# Altium footprint library Connectors SMD.PcbLib: 130 footprints (part 7 of 12)
Each footprint in its own frame and in the unit in brackets; x right, y up, seen from the top. Pads: shape width x height; smd on the part's side, far side on the other; paste and mask are expansions set on the pad; w line width, h text height; cw(c..) or ccw(c..) is an arc to the next point about the centre after c.
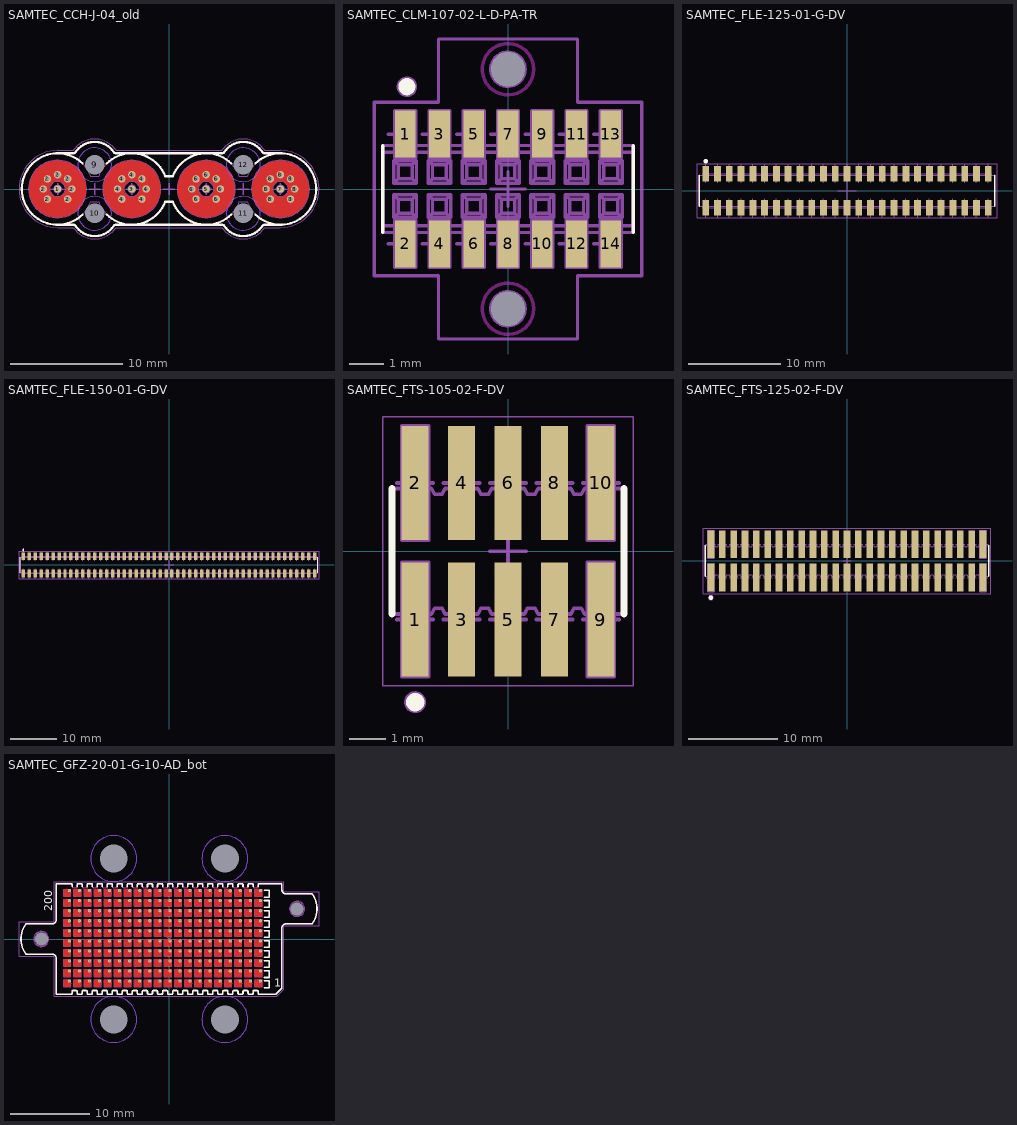
[diagram p6: the footprints below, top view; thin cyan lines are the x and y axes]

## SAMTEC_CCH-J-04_old [mm] "4 Positions CCH - Bull's Eye Low Cost High Performance SMA Test Point"
height 7.62
pads (36):
  round 0.66 hole 0.25: 1(-9.902,0) 3(-3.298,0) 5(3.298,0) 7(9.902,0)
  round 0.66 hole 0.4: 2(-11.172,0) 2(-10.8,-0.898) 2(-10.8,0.898) 2(-9.902,1.27) 2(-9.004,-0.898) 2(-9.004,0.898) 2(-8.632,0) 4(-4.568,0) 4(-4.196,-0.898) 4(-4.196,0.898) 4(-3.298,1.27) 4(-2.4,-0.898) 4(-2.4,0.898) 4(-2.028,0) 6(2.028,0) 6(2.4,-0.898) 6(2.4,0.898) 6(3.298,1.27) 6(4.196,-0.898) 6(4.196,0.898) 6(4.568,0) 8(8.632,0) 8(9.004,-0.898) 8(9.004,0.898) 8(9.902,1.27) 8(10.8,-0.898) 8(10.8,0.898) 8(11.172,0)
  round 1 hole 1.7 unplated mask+0.35: 9(-6.6,2.159) 10(-6.6,-2.159) 11(6.6,-2.159) 12(6.6,2.159)
Top Layer:
  circle w1.84: c-9.902,0 r1.62
  circle w1.84: c-3.298,0 r1.62
  circle w1.84: c3.298,0 r1.62
  circle w1.84: c9.902,0 r1.62
Bottom Layer keep-out:
  circle w0.1: c6.604,2.159 r1.5
  circle w0.1: c6.604,-2.159 r1.5
  circle w0.1: c-6.604,2.159 r1.5
  circle w0.1: c-6.604,-2.159 r1.5
Top Overlay:
  lines w0.2: -10.829,-3.038 ccw(c-9.906,0) -8.983,-3.038 ; -10.829,3.038 cw(c-9.906,0) -8.983,3.038 ; -9.906,-3.175 -8.505,-3.175 cw(c-8.505,-3.429) -8.294,-3.288 ccw(c-6.604,-2.159) -4.914,-3.288 cw(c-4.703,-3.429) -4.703,-3.175 4.703,-3.175 cw(c4.703,-3.429) 4.914,-3.288 ccw(c6.604,-2.159) 8.294,-3.288 cw(c8.505,-3.429) 8.505,-3.175 9.906,-3.175 ; -9.906,3.175 -8.505,3.175 ccw(c-8.505,3.429) -8.294,3.288 cw(c-6.604,2.159) -4.914,3.288 ccw(c-4.703,3.429) -4.703,3.175 4.703,3.175 ccw(c4.703,3.429) 4.914,3.288 cw(c6.604,2.159) 8.294,3.288 ccw(c8.505,3.429) 8.505,3.175 9.906,3.175 ; -7.678,-2.262 cw(c-9.906,0) -7.678,2.262 ; -5.53,-2.262 ccw(c-3.302,0) -0.34,-1.143 0.34,-1.143 ccw(c3.302,0) 5.53,-2.262 ; -5.53,2.262 cw(c-3.302,0) -0.34,1.143 0.34,1.143 cw(c3.302,0) 5.53,2.262 ; -4.225,-3.038 ccw(c-3.302,0) -2.379,-3.038 ; -4.225,3.038 cw(c-3.302,0) -2.379,3.038 ; 2.379,-3.038 ccw(c3.302,0) 4.225,-3.038 ; 2.379,3.038 cw(c3.302,0) 4.225,3.038 ; 7.678,-2.262 ccw(c9.906,0) 7.678,2.262 ; 8.983,-3.038 ccw(c9.906,0) 10.829,-3.038 ; 8.983,3.038 cw(c9.906,0) 10.829,3.038
Mechanical 8:
  drawing of 224 lines, arcs and shapes, not listed
Mechanical 14:
  circle w0.1: c3.302,0 r1.378
  circle w0.1: c3.302,0 r1.651
  circle w0.1: c9.906,0 r1.378
  circle w0.1: c9.906,0 r1.651
  circle w0.1: c6.604,2.159 r0.679
  circle w0.1: c6.604,-2.159 r0.679
  circle w0.1: c-9.906,0 r1.378
  circle w0.1: c-9.906,0 r1.651
  circle w0.1: c-3.302,0 r1.378
  circle w0.1: c-3.302,0 r1.651
  circle w0.1: c-6.604,2.159 r0.679
  circle w0.1: c-6.604,-2.159 r0.679
  lines w0.1: -10.829,-3.038 ccw(c-9.906,0) -8.983,-3.038 ; -10.829,3.038 cw(c-9.906,0) -8.983,3.038 ; -9.906,-3.175 -8.505,-3.175 cw(c-8.505,-3.429) -8.294,-3.288 ccw(c-6.604,-2.159) -4.914,-3.288 cw(c-4.703,-3.429) -4.703,-3.175 4.703,-3.175 cw(c4.703,-3.429) 4.914,-3.288 ccw(c6.604,-2.159) 8.294,-3.288 cw(c8.505,-3.429) 8.505,-3.175 9.906,-3.175 ; -9.906,3.175 -8.505,3.175 ccw(c-8.505,3.429) -8.294,3.288 cw(c-6.604,2.159) -4.914,3.288 ccw(c-4.703,3.429) -4.703,3.175 4.703,3.175 ccw(c4.703,3.429) 4.914,3.288 cw(c6.604,2.159) 8.294,3.288 ccw(c8.505,3.429) 8.505,3.175 9.906,3.175 ; -4.225,-3.038 ccw(c-3.302,0) -2.379,-3.038 ; -4.225,3.038 cw(c-3.302,0) -2.379,3.038 ; 2.379,-3.038 ccw(c3.302,0) 4.225,-3.038 ; 2.379,3.038 cw(c3.302,0) 4.225,3.038 ; 8.983,-3.038 ccw(c9.906,0) 10.829,-3.038 ; 8.983,3.038 cw(c9.906,0) 10.829,3.038 ; -6.944,-1.143 cw(c-9.906,0) -6.944,1.143 -6.264,1.143 cw(c-3.302,0) -0.34,1.143 0.34,1.143 cw(c3.302,0) 6.264,1.143 6.944,1.143 cw(c9.906,0) 6.944,-1.143 6.264,-1.143 cw(c3.302,0) 0.34,-1.143 -0.34,-1.143 cw(c-3.302,0) -6.264,-1.143 -6.944,-1.143
Mechanical 15:
  lines w0.05: -8.505,-3.425 -9.906,-3.425 cw(c-9.906,0) -9.906,3.425 -8.505,3.425 ; -8.501,-3.427 ccw(c-6.604,-2.159) -4.707,-3.427 ; -8.501,3.427 cw(c-6.604,2.159) -4.707,3.427 ; -4.703,-3.425 4.703,-3.425 ; -4.703,3.425 4.703,3.425 ; 4.707,-3.427 ccw(c6.604,-2.159) 8.501,-3.427 ; 4.707,3.427 cw(c6.604,2.159) 8.501,3.427 ; 8.505,-3.425 9.906,-3.425 ccw(c9.906,0) 9.906,3.425 8.505,3.425
Drill Drawing:
  lines w0.1: -7.8,2.9 -9.9,2.9 -9.9,0.8 ; -3.296,2.9 -3.296,0.8 ; 3.3,2.9 3.3,0.8 ; 7.804,2.9 9.904,2.9 9.904,0.8 ; -9.9,0.8 -9.75,0.95 -10.05,0.95 -9.9,0.8 ; -3.296,0.8 -3.146,0.95 -3.446,0.95 -3.296,0.8 ; 3.3,0.8 3.45,0.95 3.15,0.95 3.3,0.8 ; 9.904,0.8 10.054,0.95 9.754,0.95 9.904,0.8
  text "4 Filled holes" at -6.5,3.3 h1
3D body: height 7.62, standoff 0, extent -13.081,-4.171 13.081,4.171
3D body: height 3.16, standoff -2.62, extent -7.999,-3.55 7.999,3.554

## SAMTEC_CLM-107-02-L-D-PA-TR [mm] "14 Contacts - Pitch 1mm - Dual Row Surface Mount Straight Strip Header With Integral Alignment Pin"
height 2.26
pads (16):
  rect 0.61x1.37 smd: 1(-3,1.6) 2(-3,-1.6) 3(-2,1.6) 4(-2,-1.6) 5(-1,1.6) 6(-1,-1.6) 7(0,1.6) 8(0,-1.6) 9(1,1.6) 10(1,-1.6) 11(2,1.6) 12(2,-1.6) 13(3,1.6) 14(3,-1.6)
  round 0.5 hole 1 unplated mask+0.25: POS1(0,3.495) POS2(0,-3.495)
Top Layer keep-out:
  circle w0.1: c0,-3.495 r0.75
  circle w0.1: c0,3.495 r0.75
Top Overlay:
  circle w0.25: c-2.952,2.985 r0.125
  circle w0.25: c-2.952,2.985 r0.125
  lines w0.1: -3.659,-1.27 -3.659,1.27 ; 3.659,-1.27 3.659,1.27
Mechanical 8:
  circle w0.1: c0,3.495 r0.5
  circle w0.1: c0,-3.495 r0.5
  lines w0.1: -3.5,-1.6 -3,-1.6 ; -3.5,1.6 -3,1.6 ; -3,-2.1 -3,-1.6 ; -3,-1.1 -3,-1.6 ; -3,1.1 -3,1.6 ; -3,2.1 -3,1.6 ; -2.5,-1.6 -2,-1.6 ; -2.5,1.6 -2,1.6 ; -2,-2.1 -2,-1.6 ; -2,-1.1 -2,-1.6 ; -2,1.1 -2,1.6 ; -2,2.1 -2,1.6 ; -1.5,-1.6 -1,-1.6 ; -1.5,1.6 -1,1.6 ; -1,-2.1 -1,-1.6 ; -1,-1.1 -1,-1.6 ; -1,1.1 -1,1.6 ; -1,2.1 -1,1.6 ; -0.5,-3.495 0,-3.495 ; -0.5,-1.6 0,-1.6 ; -0.5,0 0,0 ; -0.5,1.6 0,1.6 ; -0.5,3.495 0,3.495 ; 0,-3.995 0,-3.495 ; 0,-2.995 0,-3.495 ; 0,-2.1 0,-1.6 ; 0,-1.1 0,-1.6 ; 0,-0.5 0,0 ; 0,0.5 0,0 ; 0,1.1 0,1.6 ; 0,2.1 0,1.6 ; 0,2.995 0,3.495 ; 0,3.995 0,3.495 ; 0.5,-3.495 0,-3.495 ; 0.5,-1.6 1,-1.6 ; 0.5,0 0,0 ; 0.5,1.6 1,1.6 ; 0.5,3.495 0,3.495 ; 1,-2.1 1,-1.6 ; 1,-1.1 1,-1.6 ; 1,1.1 1,1.6 ; 1,2.1 1,1.6 ; 1.5,-1.6 2,-1.6 ; 1.5,1.6 2,1.6 ; 2,-2.1 2,-1.6 ; 2,-1.1 2,-1.6 ; 2,1.1 2,1.6 ; 2,2.1 2,1.6 ; 2.5,-1.6 3,-1.6 ; 2.5,1.6 3,1.6 ; 3,-2.1 3,-1.6 ; 3,-1.1 3,-1.6 ; 3,1.1 3,1.6 ; 3,2.1 3,1.6 ; -3.305,-2.285 -2.695,-2.285 -2.695,-0.915 -3.305,-0.915 -3.305,-2.285 ; -3.305,0.915 -2.695,0.915 -2.695,2.285 -3.305,2.285 -3.305,0.915 ; -2.305,-2.285 -1.695,-2.285 -1.695,-0.915 -2.305,-0.915 -2.305,-2.285 ; -2.305,0.915 -1.695,0.915 -1.695,2.285 -2.305,2.285 -2.305,0.915 ; -1.305,-2.285 -0.695,-2.285 -0.695,-0.915 -1.305,-0.915 -1.305,-2.285 ; -1.305,0.915 -0.695,0.915 -0.695,2.285 -1.305,2.285 -1.305,0.915 ; -0.305,-2.285 0.305,-2.285 0.305,-0.915 -0.305,-0.915 -0.305,-2.285 ; -0.305,0.915 0.305,0.915 0.305,2.285 -0.305,2.285 -0.305,0.915 ; 0.695,-2.285 1.305,-2.285 1.305,-0.915 0.695,-0.915 0.695,-2.285 ; 0.695,0.915 1.305,0.915 1.305,2.285 0.695,2.285 0.695,0.915 ; 1.695,-2.285 2.305,-2.285 2.305,-0.915 1.695,-0.915 1.695,-2.285 ; 1.695,0.915 2.305,0.915 2.305,2.285 1.695,2.285 1.695,0.915 ; 2.695,-2.285 3.305,-2.285 3.305,-0.915 2.695,-0.915 2.695,-2.285 ; 2.695,0.915 3.305,0.915 3.305,2.285 2.695,2.285 2.695,0.915
Mechanical 14:
  drawing of 217 lines, arcs and shapes, not listed
Mechanical 15:
  lines w0.1: -3.909,-2.535 -2.028,-2.535 -2.028,-4.378 2.028,-4.378 2.028,-2.535 3.909,-2.535 3.909,2.535 2.028,2.535 2.028,4.378 -2.028,4.378 -2.028,2.535 -3.909,2.535 -3.909,-2.535
3D body: height 2.25, standoff 0, extent -3.659,-1.905 3.659,1.905
3D body: height 3.01, standoff -1.36, extent -1.778,-4.127 1.778,4.128

## SAMTEC_FLE-125-01-G-DV [mm] "50 Contacts - Pitch 1.27mm - Top Entry, Dual Row Surface Mount Receptacle"
height 4.55
pads (50):
  rect 0.74x1.675 smd: 1(-15.24,1.843) 2(-15.24,-1.843) 3(-13.97,1.843) 4(-13.97,-1.843) 5(-12.7,1.843) 6(-12.7,-1.843) 7(-11.43,1.843) 8(-11.43,-1.843) 9(-10.16,1.843) 10(-10.16,-1.843) 11(-8.89,1.843) 12(-8.89,-1.843) 13(-7.62,1.843) 14(-7.62,-1.843) 15(-6.35,1.843) 16(-6.35,-1.843) 17(-5.08,1.843) 18(-5.08,-1.843) 19(-3.81,1.843) 20(-3.81,-1.843) 21(-2.54,1.843) 22(-2.54,-1.843) 23(-1.27,1.843) 24(-1.27,-1.843) 25(0,1.843) 26(0,-1.843) 27(1.27,1.843) 28(1.27,-1.843) 29(2.54,1.843) 30(2.54,-1.843) 31(3.81,1.843) 32(3.81,-1.843) 33(5.08,1.843) 34(5.08,-1.843) 35(6.35,1.843) 36(6.35,-1.843) 37(7.62,1.843) 38(7.62,-1.843) 39(8.89,1.843) 40(8.89,-1.843) 41(10.16,1.843) 42(10.16,-1.843) 43(11.43,1.843) 44(11.43,-1.843) 45(12.7,1.843) 46(12.7,-1.843) 47(13.97,1.843) 48(13.97,-1.843) 49(15.24,1.843) 50(15.24,-1.843)
Top Overlay:
  circle w0.25: c-15.242,3.175 r0.125
  lines w0.2: -15.932,-1.664 -15.932,1.664 ; 15.932,-1.664 15.932,1.664
Mechanical 8:
  lines w0.1: -15.61,-1.843 15.61,-1.843 ; -15.61,1.843 15.61,1.843 ; -15.24,-2.843 -15.24,-1.843 -15.24,-0.843 ; -15.24,0.843 -15.24,1.843 -15.24,2.843 ; -13.97,-2.843 -13.97,-1.843 -13.97,-0.843 ; -13.97,0.843 -13.97,1.843 -13.97,2.843 ; -12.7,-2.843 -12.7,-1.843 -12.7,-0.843 ; -12.7,0.843 -12.7,1.843 -12.7,2.843 ; -11.43,-2.843 -11.43,-1.843 -11.43,-0.843 ; -11.43,0.843 -11.43,1.843 -11.43,2.843 ; -10.16,-2.843 -10.16,-1.843 -10.16,-0.843 ; -10.16,0.843 -10.16,1.843 -10.16,2.843 ; -8.89,-2.843 -8.89,-1.843 -8.89,-0.843 ; -8.89,0.843 -8.89,1.843 -8.89,2.843 ; -7.62,-2.843 -7.62,-1.843 -7.62,-0.843 ; -7.62,0.843 -7.62,1.843 -7.62,2.843 ; -6.35,-2.843 -6.35,-1.843 -6.35,-0.843 ; -6.35,0.843 -6.35,1.843 -6.35,2.843 ; -5.08,-2.843 -5.08,-1.843 -5.08,-0.843 ; -5.08,0.843 -5.08,1.843 -5.08,2.843 ; -3.81,-2.843 -3.81,-1.843 -3.81,-0.843 ; -3.81,0.843 -3.81,1.843 -3.81,2.843 ; -2.54,-2.843 -2.54,-1.843 -2.54,-0.843 ; -2.54,0.843 -2.54,1.843 -2.54,2.843 ; -1.27,-2.843 -1.27,-1.843 -1.27,-0.843 ; -1.27,0.843 -1.27,1.843 -1.27,2.843 ; -1,0 0,0 ; 0,-2.843 0,-1.843 0,-0.843 ; 0,-1 0,0 ; 0,0.843 0,1.843 0,2.843 ; 0,1 0,0 ; 1,0 0,0 ; 1.27,-2.843 1.27,-1.843 1.27,-0.843 ; 1.27,0.843 1.27,1.843 1.27,2.843 ; 2.54,-2.843 2.54,-1.843 2.54,-0.843 ; 2.54,0.843 2.54,1.843 2.54,2.843 ; 3.81,-2.843 3.81,-1.843 3.81,-0.843 ; 3.81,0.843 3.81,1.843 3.81,2.843 ; 5.08,-2.843 5.08,-1.843 5.08,-0.843 ; 5.08,0.843 5.08,1.843 5.08,2.843 ; 6.35,-2.843 6.35,-1.843 6.35,-0.843 ; 6.35,0.843 6.35,1.843 6.35,2.843 ; 7.62,-2.843 7.62,-1.843 7.62,-0.843 ; 7.62,0.843 7.62,1.843 7.62,2.843 ; 8.89,-2.843 8.89,-1.843 8.89,-0.843 ; 8.89,0.843 8.89,1.843 8.89,2.843 ; 10.16,-2.843 10.16,-1.843 10.16,-0.843 ; 10.16,0.843 10.16,1.843 10.16,2.843 ; 11.43,-2.843 11.43,-1.843 11.43,-0.843 ; 11.43,0.843 11.43,1.843 11.43,2.843 ; 12.7,-2.843 12.7,-1.843 12.7,-0.843 ; 12.7,0.843 12.7,1.843 12.7,2.843 ; 13.97,-2.843 13.97,-1.843 13.97,-0.843 ; 13.97,0.843 13.97,1.843 13.97,2.843 ; 15.24,-2.843 15.24,-1.843 15.24,-0.843 ; 15.24,0.843 15.24,1.843 15.24,2.843
Mechanical 14:
  circle w0.1: c-15.242,3.175 r0.125
  lines w0.1: -15.932,-1.664 -15.932,1.664 15.932,1.664 15.932,-1.664 -15.932,-1.664
Mechanical 15:
  lines w0.1: -16.182,-2.93 16.182,-2.93 16.182,2.93 -16.182,2.93 -16.182,-2.93
3D body: height 4.55, standoff 0, extent -15.932,-2.299 15.932,2.299

## SAMTEC_FLE-150-01-G-DV [mm] "100 Contacts - Pitch 1.27mm - Top Entry, Dual Row Surface Mount Receptacle"
height 4.55
pads (100):
  rect 0.74x1.675 smd: 1(-31.115,1.843) 2(-31.115,-1.843) 3(-29.845,1.843) 4(-29.845,-1.843) 5(-28.575,1.843) 6(-28.575,-1.843) 7(-27.305,1.843) 8(-27.305,-1.843) 9(-26.035,1.843) 10(-26.035,-1.843) 11(-24.765,1.843) 12(-24.765,-1.843) 13(-23.495,1.843) 14(-23.495,-1.843) 15(-22.225,1.843) 16(-22.225,-1.843) 17(-20.955,1.843) 18(-20.955,-1.843) 19(-19.685,1.843) 20(-19.685,-1.843) 21(-18.415,1.843) 22(-18.415,-1.843) 23(-17.145,1.843) 24(-17.145,-1.843) 25(-15.875,1.843) 26(-15.875,-1.843) 27(-14.605,1.843) 28(-14.605,-1.843) 29(-13.335,1.843) 30(-13.335,-1.843) 31(-12.065,1.843) 32(-12.065,-1.843) 33(-10.795,1.843) 34(-10.795,-1.843) 35(-9.525,1.843) 36(-9.525,-1.843) 37(-8.255,1.843) 38(-8.255,-1.843) 39(-6.985,1.843) 40(-6.985,-1.843) 41(-5.715,1.843) 42(-5.715,-1.843) 43(-4.445,1.843) 44(-4.445,-1.843) 45(-3.175,1.843) 46(-3.175,-1.843) 47(-1.905,1.843) 48(-1.905,-1.843) 49(-0.635,1.843) 50(-0.635,-1.843) 51(0.635,1.843) 52(0.635,-1.843) 53(1.905,1.843) 54(1.905,-1.843) 55(3.175,1.843) 56(3.175,-1.843) 57(4.445,1.843) 58(4.445,-1.843) 59(5.715,1.843) 60(5.715,-1.843) 61(6.985,1.843) 62(6.985,-1.843) 63(8.255,1.843) 64(8.255,-1.843) 65(9.525,1.843) 66(9.525,-1.843) 67(10.795,1.843) 68(10.795,-1.843) 69(12.065,1.843) 70(12.065,-1.843) 71(13.335,1.843) 72(13.335,-1.843) 73(14.605,1.843) 74(14.605,-1.843) 75(15.875,1.843) 76(15.875,-1.843) 77(17.145,1.843) 78(17.145,-1.843) 79(18.415,1.843) 80(18.415,-1.843) 81(19.685,1.843) 82(19.685,-1.843) 83(20.955,1.843) 84(20.955,-1.843) 85(22.225,1.843) 86(22.225,-1.843) 87(23.495,1.843) 88(23.495,-1.843) 89(24.765,1.843) 90(24.765,-1.843) 91(26.035,1.843) 92(26.035,-1.843) 93(27.305,1.843) 94(27.305,-1.843) 95(28.575,1.843) 96(28.575,-1.843) 97(29.845,1.843) 98(29.845,-1.843) 99(31.115,1.843) 100(31.115,-1.843)
Top Overlay:
  circle w0.25: c-31.117,3.175 r0.125
  lines w0.2: -31.807,-1.664 -31.807,1.664 ; 31.807,-1.664 31.807,1.664
Mechanical 8:
  drawing of 206 lines, arcs and shapes, not listed
Mechanical 14:
  circle w0.1: c-31.117,3.175 r0.125
  lines w0.1: -31.807,-1.664 -31.807,1.664 31.807,1.664 31.807,-1.664 -31.807,-1.664
Mechanical 15:
  lines w0.1: -32.057,-2.93 32.057,-2.93 32.057,2.93 -32.057,2.93 -32.057,-2.93
3D body: height 4.55, standoff 0, extent -31.807,-2.299 31.807,2.299

## SAMTEC_FTS-105-02-F-DV [mm] "10 Contacts - Pitch 1.27mm - Dual Row, Vertical, Surface Mount Terminal Strip"
height 3.18
pads (10):
  rect 0.74x3.125 smd: 1(-2.54,-1.868) 2(-2.54,1.868) 3(-1.27,-1.868) 4(-1.27,1.868) 5(0,-1.868) 6(0,1.868) 7(1.27,-1.868) 8(1.27,1.868) 9(2.54,-1.868) 10(2.54,1.868)
Top Overlay:
  circle w0.25: c-2.538,-4.128 r0.125
  circle w0.25: c-2.538,-4.128 r0.125
  lines w0.2: -3.175,-1.714 -3.175,1.714 ; 3.175,-1.714 3.175,1.714
Mechanical 8:
  lines w0.1: -3.04,-1.868 -2.54,-1.868 ; -3.04,1.868 -2.54,1.868 ; -2.54,-2.368 -2.54,-1.868 ; -2.54,-1.368 -2.54,-1.868 ; -2.54,1.368 -2.54,1.868 ; -2.54,2.368 -2.54,1.868 ; -2.04,-1.868 -2.54,-1.868 ; -2.04,1.868 -2.54,1.868 ; -1.77,-1.868 -1.27,-1.868 ; -1.77,1.868 -1.27,1.868 ; -1.27,-2.368 -1.27,-1.868 ; -1.27,-1.368 -1.27,-1.868 ; -1.27,1.368 -1.27,1.868 ; -1.27,2.368 -1.27,1.868 ; -0.77,-1.868 -1.27,-1.868 ; -0.77,1.868 -1.27,1.868 ; -0.5,-1.868 0,-1.868 ; -0.5,0 0,0 ; -0.5,1.868 0,1.868 ; 0,-2.368 0,-1.868 ; 0,-1.368 0,-1.868 ; 0,-0.5 0,0 ; 0,0.5 0,0 ; 0,1.368 0,1.868 ; 0,2.368 0,1.868 ; 0.5,-1.868 0,-1.868 ; 0.5,0 0,0 ; 0.5,1.868 0,1.868 ; 0.77,-1.868 1.27,-1.868 ; 0.77,1.868 1.27,1.868 ; 1.27,-2.368 1.27,-1.868 ; 1.27,-1.368 1.27,-1.868 ; 1.27,1.368 1.27,1.868 ; 1.27,2.368 1.27,1.868 ; 1.77,-1.868 1.27,-1.868 ; 1.77,1.868 1.27,1.868 ; 2.04,-1.868 2.54,-1.868 ; 2.04,1.868 2.54,1.868 ; 2.54,-2.368 2.54,-1.868 ; 2.54,-1.368 2.54,-1.868 ; 2.54,1.368 2.54,1.868 ; 2.54,2.368 2.54,1.868 ; 3.04,-1.868 2.54,-1.868 ; 3.04,1.868 2.54,1.868 ; -2.91,-3.43 -2.17,-3.43 -2.17,-0.305 -2.91,-0.305 -2.91,-3.43 ; -2.91,0.305 -2.91,3.43 -2.17,3.43 -2.17,0.305 -2.91,0.305 ; 2.17,-3.43 2.17,-0.305 2.91,-0.305 2.91,-3.43 2.17,-3.43 ; 2.17,0.305 2.17,3.43 2.91,3.43 2.91,0.305 2.17,0.305
Mechanical 14:
  drawing of 187 lines, arcs and shapes, not listed
Mechanical 15:
  lines w0.05: -3.425,-3.68 3.425,-3.68 3.425,3.68 -3.425,3.68 -3.425,-3.68
3D body: height 3.17, standoff 0, extent -3.175,-2.921 3.175,2.921

## SAMTEC_FTS-125-02-F-DV [mm] "50 Contacts - Pitch 1.27mm - Dual Row, Vertical, Surface Mount Terminal Strip"
height 3.18
pads (50):
  rect 0.74x3.125 smd: 1(-15.24,-1.868) 2(-15.24,1.868) 3(-13.97,-1.868) 4(-13.97,1.868) 5(-12.7,-1.868) 6(-12.7,1.868) 7(-11.43,-1.868) 8(-11.43,1.868) 9(-10.16,-1.868) 10(-10.16,1.868) 11(-8.89,-1.868) 12(-8.89,1.868) 13(-7.62,-1.868) 14(-7.62,1.868) 15(-6.35,-1.868) 16(-6.35,1.868) 17(-5.08,-1.868) 18(-5.08,1.868) 19(-3.81,-1.868) 20(-3.81,1.868) 21(-2.54,-1.868) 22(-2.54,1.868) 23(-1.27,-1.868) 24(-1.27,1.868) 25(0,-1.868) 26(0,1.868) 27(1.27,-1.868) 28(1.27,1.868) 29(2.54,-1.868) 30(2.54,1.868) 31(3.81,-1.868) 32(3.81,1.868) 33(5.08,-1.868) 34(5.08,1.868) 35(6.35,-1.868) 36(6.35,1.868) 37(7.62,-1.868) 38(7.62,1.868) 39(8.89,-1.868) 40(8.89,1.868) 41(10.16,-1.868) 42(10.16,1.868) 43(11.43,-1.868) 44(11.43,1.868) 45(12.7,-1.868) 46(12.7,1.868) 47(13.97,-1.868) 48(13.97,1.868) 49(15.24,-1.868) 50(15.24,1.868)
Top Overlay:
  circle w0.25: c-15.238,-4.128 r0.125
  circle w0.25: c-15.238,-4.128 r0.125
  lines w0.2: -15.875,-1.714 -15.875,1.714 ; 15.875,-1.714 15.875,1.714
Mechanical 8:
  drawing of 220 lines, arcs and shapes, not listed
Mechanical 14:
  drawing of 947 lines, arcs and shapes, not listed
Mechanical 15:
  lines w0.05: -16.125,-3.68 16.125,-3.68 16.125,3.68 -16.125,3.68 -16.125,-3.68
3D body: height 4.32, standoff 0, extent -15.875,-2.921 15.875,2.921

## SAMTEC_GFZ-20-01-G-10-AD_bot [mm] "Z-Beam, High Speed 200 Pins, Pitch 1.27mm, Low Profile 1.65mm, Grid Array (20x10) Solderless SMT Board Stacking Connector"
height 1.65
pads (206):
  round 0.4 hole 0.2: 1(11.546,-5.318) 2(11.546,-4.048) 3(11.546,-2.778) 4(11.546,-1.508) 5(11.546,-0.238) 6(11.546,1.032) 7(11.546,2.302) 8(11.546,3.572) 9(11.546,4.842) 10(11.546,6.112) 11(10.276,-5.318) 12(10.276,-4.048) 13(10.276,-2.778) 14(10.276,-1.508) 15(10.276,-0.238) 16(10.276,1.032) 17(10.276,2.302) 18(10.276,3.572) 19(10.276,4.842) 20(10.276,6.112) 21(9.006,-5.318) 22(9.006,-4.048) 23(9.006,-2.778) 24(9.006,-1.508) 25(9.006,-0.238) 26(9.006,1.032) 27(9.006,2.302) 28(9.006,3.572) 29(9.006,4.842) 30(9.006,6.112) 31(7.736,-5.318) 32(7.736,-4.065) 33(7.736,-2.795) 34(7.736,-1.525) 35(7.736,-0.255) 36(7.736,1.015) 37(7.736,2.285) 38(7.736,3.555) 39(7.736,4.825) 40(7.736,6.095) 41(6.466,-5.318) 42(6.466,-4.048) 43(6.466,-2.778) 44(6.466,-1.508) 45(6.466,-0.238) 46(6.466,1.032) 47(6.466,2.302) 48(6.466,3.572) 49(6.466,4.842) 50(6.466,6.112) 51(5.196,-5.318) 52(5.196,-4.048) 53(5.196,-2.778) 54(5.196,-1.508) 55(5.196,-0.238) 56(5.196,1.032) 57(5.196,2.302) 58(5.196,3.572) 59(5.196,4.842) 60(5.196,6.112) 61(3.926,-5.318) 62(3.926,-4.048) 63(3.926,-2.778) 64(3.926,-1.508) 65(3.926,-0.238) 66(3.926,1.032) 67(3.926,2.302) 68(3.926,3.572) 69(3.926,4.842) 70(3.926,6.112) 71(2.656,-5.318) 72(2.656,-4.048) 73(2.656,-2.778) 74(2.656,-1.508) 75(2.656,-0.238) 76(2.656,1.032) 77(2.656,2.302) 78(2.656,3.572) 79(2.656,4.842) 80(2.656,6.112) 81(1.386,-5.318) 82(1.386,-4.048) 83(1.386,-2.778) 84(1.386,-1.508) 85(1.386,-0.238) 86(1.386,1.032) 87(1.386,2.302) 88(1.386,3.572) 89(1.386,4.842) 90(1.386,6.112) 91(0.116,-5.318) 92(0.116,-4.048) 93(0.116,-2.778) 94(0.116,-1.508) 95(0.116,-0.238) 96(0.116,1.032) 97(0.116,2.302) 98(0.116,3.572) 99(0.116,4.842) 100(0.116,6.112) 101(-1.154,-5.318) 102(-1.154,-4.048) 103(-1.154,-2.778) 104(-1.154,-1.508) 105(-1.154,-0.238) 106(-1.154,1.032) 107(-1.154,2.302) 108(-1.154,3.572) 109(-1.154,4.842) 110(-1.154,6.112) 111(-2.424,-5.318) 112(-2.424,-4.048) 113(-2.424,-2.778) 114(-2.424,-1.508) 115(-2.424,-0.238) 116(-2.424,1.032) 117(-2.424,2.302) 118(-2.424,3.572) 119(-2.424,4.842) 120(-2.424,6.112) 121(-3.694,-5.318) 122(-3.694,-4.048) 123(-3.694,-2.778) 124(-3.694,-1.508) 125(-3.694,-0.238) 126(-3.694,1.032) 127(-3.694,2.302) 128(-3.694,3.572) 129(-3.694,4.842) 130(-3.694,6.112) 131(-4.964,-5.318) 132(-4.964,-4.048) 133(-4.964,-2.778) 134(-4.964,-1.508) 135(-4.964,-0.238) 136(-4.964,1.032) 137(-4.964,2.302) 138(-4.964,3.572) 139(-4.964,4.842) 140(-4.964,6.112) 141(-6.234,-5.318) 142(-6.234,-4.048) 143(-6.234,-2.778) 144(-6.234,-1.508) 145(-6.234,-0.238) 146(-6.234,1.032) 147(-6.234,2.302) 148(-6.234,3.572) 149(-6.234,4.842) 150(-6.234,6.112) 151(-7.504,-5.318) 152(-7.504,-4.048) 153(-7.504,-2.778) 154(-7.504,-1.508) 155(-7.504,-0.238) 156(-7.504,1.032) 157(-7.504,2.302) 158(-7.504,3.572) 159(-7.504,4.842) 160(-7.504,6.112) 161(-8.774,-5.318) 162(-8.774,-4.048) 163(-8.774,-2.778) 164(-8.774,-1.508) 165(-8.774,-0.238) 166(-8.774,1.032) 167(-8.774,2.302) 168(-8.774,3.572) 169(-8.774,4.842) 170(-8.774,6.112) 171(-10.044,-5.318) 172(-10.044,-4.048) 173(-10.044,-2.778) 174(-10.044,-1.508) 175(-10.044,-0.238) 176(-10.044,1.032) 177(-10.044,2.302) 178(-10.044,3.572) 179(-10.044,4.842) 180(-10.044,6.112) 181(-11.314,-5.318) 182(-11.314,-4.048) 183(-11.314,-2.778) 184(-11.314,-1.508) 185(-11.314,-0.238) 186(-11.314,1.032) 187(-11.314,2.302) 188(-11.314,3.572) 189(-11.314,4.842) 190(-11.314,6.112) 191(-12.584,-5.318) 192(-12.584,-4.048) 193(-12.584,-2.778) 194(-12.584,-1.508) 195(-12.584,-0.238) 196(-12.584,1.032) 197(-12.584,2.302) 198(-12.584,3.572) 199(-12.584,4.842) 200(-12.584,6.112)
  round 1 hole 1.65 unplated mask+0.325: MEC1(-16.129,0) MEC2(16.181,3.81)
  round 1 hole 3.5 unplated mask+1.25: MEC3(-6.989,10.16) MEC4(7.061,10.16) MEC5(-6.989,-10.16) MEC6(7.061,-10.16)
Top Layer:
  region: 10.856,-5.118 11.746,-5.118 11.746,-6.008 10.856,-6.008
  region: 10.856,6.312 11.746,6.312 11.746,5.422 10.856,5.422
  region: 9.586,6.312 10.476,6.312 10.476,5.422 9.586,5.422
  region: 8.316,6.312 9.206,6.312 9.206,5.422 8.316,5.422
  region: 7.046,6.312 7.936,6.312 7.936,5.422 7.046,5.422
  region: 5.776,6.312 6.666,6.312 6.666,5.422 5.776,5.422
  region: 4.506,6.312 5.396,6.312 5.396,5.422 4.506,5.422
  region: 3.236,6.312 4.126,6.312 4.126,5.422 3.236,5.422
  region: 1.966,6.312 2.856,6.312 2.856,5.422 1.966,5.422
  region: 0.696,6.312 1.586,6.312 1.586,5.422 0.696,5.422
  region: -0.574,6.312 0.316,6.312 0.316,5.422 -0.574,5.422
  region: -1.844,6.312 -0.954,6.312 -0.954,5.422 -1.844,5.422
  region: -3.114,6.312 -2.224,6.312 -2.224,5.422 -3.114,5.422
  region: -4.384,6.312 -3.494,6.312 -3.494,5.422 -4.384,5.422
  region: -5.654,6.312 -4.764,6.312 -4.764,5.422 -5.654,5.422
  region: -6.924,6.312 -6.034,6.312 -6.034,5.422 -6.924,5.422
  region: -8.194,6.312 -7.304,6.312 -7.304,5.422 -8.194,5.422
  region: -9.464,6.312 -8.574,6.312 -8.574,5.422 -9.464,5.422
  region: -10.734,6.312 -9.844,6.312 -9.844,5.422 -10.734,5.422
  region: -12.004,6.312 -11.114,6.312 -11.114,5.422 -12.004,5.422
  region: -13.274,6.312 -12.384,6.312 -12.384,5.422 -13.274,5.422
  region: 10.856,5.042 11.746,5.042 11.746,4.152 10.856,4.152
  region: 9.586,5.042 10.476,5.042 10.476,4.152 9.586,4.152
  region: 8.316,5.042 9.206,5.042 9.206,4.152 8.316,4.152
  region: 7.046,5.042 7.936,5.042 7.936,4.152 7.046,4.152
  region: 5.776,5.042 6.666,5.042 6.666,4.152 5.776,4.152
  region: 4.506,5.042 5.396,5.042 5.396,4.152 4.506,4.152
  region: 3.236,5.042 4.126,5.042 4.126,4.152 3.236,4.152
  region: 1.966,5.042 2.856,5.042 2.856,4.152 1.966,4.152
  region: 0.696,5.042 1.586,5.042 1.586,4.152 0.696,4.152
  region: -0.574,5.042 0.316,5.042 0.316,4.152 -0.574,4.152
  region: -1.844,5.042 -0.954,5.042 -0.954,4.152 -1.844,4.152
  region: -3.114,5.042 -2.224,5.042 -2.224,4.152 -3.114,4.152
  region: -4.384,5.042 -3.494,5.042 -3.494,4.152 -4.384,4.152
  region: -5.654,5.042 -4.764,5.042 -4.764,4.152 -5.654,4.152
  region: -6.924,5.042 -6.034,5.042 -6.034,4.152 -6.924,4.152
  region: -8.194,5.042 -7.304,5.042 -7.304,4.152 -8.194,4.152
  region: -9.464,5.042 -8.574,5.042 -8.574,4.152 -9.464,4.152
  region: -10.734,5.042 -9.844,5.042 -9.844,4.152 -10.734,4.152
  region: -12.004,5.042 -11.114,5.042 -11.114,4.152 -12.004,4.152
  region: -13.274,5.042 -12.384,5.042 -12.384,4.152 -13.274,4.152
  region: 10.856,3.772 11.746,3.772 11.746,2.882 10.856,2.882
  region: 9.586,3.772 10.476,3.772 10.476,2.882 9.586,2.882
  region: 8.316,3.772 9.206,3.772 9.206,2.882 8.316,2.882
  region: 7.046,3.772 7.936,3.772 7.936,2.882 7.046,2.882
  region: 5.776,3.772 6.666,3.772 6.666,2.882 5.776,2.882
  region: 4.506,3.772 5.396,3.772 5.396,2.882 4.506,2.882
  region: 3.236,3.772 4.126,3.772 4.126,2.882 3.236,2.882
  region: 1.966,3.772 2.856,3.772 2.856,2.882 1.966,2.882
  region: 0.696,3.772 1.586,3.772 1.586,2.882 0.696,2.882
  region: -0.574,3.772 0.316,3.772 0.316,2.882 -0.574,2.882
  region: -1.844,3.772 -0.954,3.772 -0.954,2.882 -1.844,2.882
  region: -3.114,3.772 -2.224,3.772 -2.224,2.882 -3.114,2.882
  region: -4.384,3.772 -3.494,3.772 -3.494,2.882 -4.384,2.882
  region: -5.654,3.772 -4.764,3.772 -4.764,2.882 -5.654,2.882
  region: -6.924,3.772 -6.034,3.772 -6.034,2.882 -6.924,2.882
  region: -8.194,3.772 -7.304,3.772 -7.304,2.882 -8.194,2.882
  region: -9.464,3.772 -8.574,3.772 -8.574,2.882 -9.464,2.882
  region: -10.734,3.772 -9.844,3.772 -9.844,2.882 -10.734,2.882
  region: -12.004,3.772 -11.114,3.772 -11.114,2.882 -12.004,2.882
  region: -13.274,3.772 -12.384,3.772 -12.384,2.882 -13.274,2.882
  region: 10.856,2.502 11.746,2.502 11.746,1.612 10.856,1.612
  region: 9.586,2.502 10.476,2.502 10.476,1.612 9.586,1.612
  region: 8.316,2.502 9.206,2.502 9.206,1.612 8.316,1.612
  region: 7.046,2.502 7.936,2.502 7.936,1.612 7.046,1.612
  region: 5.776,2.502 6.666,2.502 6.666,1.612 5.776,1.612
  region: 4.506,2.502 5.396,2.502 5.396,1.612 4.506,1.612
  region: 3.236,2.502 4.126,2.502 4.126,1.612 3.236,1.612
  region: 1.966,2.502 2.856,2.502 2.856,1.612 1.966,1.612
  region: 0.696,2.502 1.586,2.502 1.586,1.612 0.696,1.612
  region: -0.574,2.502 0.316,2.502 0.316,1.612 -0.574,1.612
  region: -1.844,2.502 -0.954,2.502 -0.954,1.612 -1.844,1.612
  region: -3.114,2.502 -2.224,2.502 -2.224,1.612 -3.114,1.612
  region: -4.384,2.502 -3.494,2.502 -3.494,1.612 -4.384,1.612
  region: -5.654,2.502 -4.764,2.502 -4.764,1.612 -5.654,1.612
  region: -6.924,2.502 -6.034,2.502 -6.034,1.612 -6.924,1.612
  region: -8.194,2.502 -7.304,2.502 -7.304,1.612 -8.194,1.612
  region: -9.464,2.502 -8.574,2.502 -8.574,1.612 -9.464,1.612
  region: -10.734,2.502 -9.844,2.502 -9.844,1.612 -10.734,1.612
  region: -12.004,2.502 -11.114,2.502 -11.114,1.612 -12.004,1.612
  region: -13.274,2.502 -12.384,2.502 -12.384,1.612 -13.274,1.612
  region: 10.856,1.232 11.746,1.232 11.746,0.342 10.856,0.342
  region: 9.586,1.232 10.476,1.232 10.476,0.342 9.586,0.342
  region: 8.316,1.232 9.206,1.232 9.206,0.342 8.316,0.342
  region: 7.046,1.232 7.936,1.232 7.936,0.342 7.046,0.342
  region: 5.776,1.232 6.666,1.232 6.666,0.342 5.776,0.342
  region: 4.506,1.232 5.396,1.232 5.396,0.342 4.506,0.342
  region: 3.236,1.232 4.126,1.232 4.126,0.342 3.236,0.342
  region: 1.966,1.232 2.856,1.232 2.856,0.342 1.966,0.342
  region: 0.696,1.232 1.586,1.232 1.586,0.342 0.696,0.342
  region: -0.574,1.232 0.316,1.232 0.316,0.342 -0.574,0.342
  region: -1.844,1.232 -0.954,1.232 -0.954,0.342 -1.844,0.342
  region: -3.114,1.232 -2.224,1.232 -2.224,0.342 -3.114,0.342
  region: -4.384,1.232 -3.494,1.232 -3.494,0.342 -4.384,0.342
  region: -5.654,1.232 -4.764,1.232 -4.764,0.342 -5.654,0.342
  region: -6.924,1.232 -6.034,1.232 -6.034,0.342 -6.924,0.342
  region: -8.194,1.232 -7.304,1.232 -7.304,0.342 -8.194,0.342
  region: -9.464,1.232 -8.574,1.232 -8.574,0.342 -9.464,0.342
  region: -10.734,1.232 -9.844,1.232 -9.844,0.342 -10.734,0.342
  region: -12.004,1.232 -11.114,1.232 -11.114,0.342 -12.004,0.342
  region: -13.274,1.232 -12.384,1.232 -12.384,0.342 -13.274,0.342
  region: 10.856,-0.038 11.746,-0.038 11.746,-0.928 10.856,-0.928
  region: 9.586,-0.038 10.476,-0.038 10.476,-0.928 9.586,-0.928
  region: 8.316,-0.038 9.206,-0.038 9.206,-0.928 8.316,-0.928
  region: 7.046,-0.038 7.936,-0.038 7.936,-0.928 7.046,-0.928
  region: 5.776,-0.038 6.666,-0.038 6.666,-0.928 5.776,-0.928
  region: 4.506,-0.038 5.396,-0.038 5.396,-0.928 4.506,-0.928
  region: 3.236,-0.038 4.126,-0.038 4.126,-0.928 3.236,-0.928
  region: 1.966,-0.038 2.856,-0.038 2.856,-0.928 1.966,-0.928
  region: 0.696,-0.038 1.586,-0.038 1.586,-0.928 0.696,-0.928
  region: -0.574,-0.038 0.316,-0.038 0.316,-0.928 -0.574,-0.928
  region: -1.844,-0.038 -0.954,-0.038 -0.954,-0.928 -1.844,-0.928
  region: -3.114,-0.038 -2.224,-0.038 -2.224,-0.928 -3.114,-0.928
  region: -4.384,-0.038 -3.494,-0.038 -3.494,-0.928 -4.384,-0.928
  region: -5.654,-0.038 -4.764,-0.038 -4.764,-0.928 -5.654,-0.928
  region: -6.924,-0.038 -6.034,-0.038 -6.034,-0.928 -6.924,-0.928
  region: -8.194,-0.038 -7.304,-0.038 -7.304,-0.928 -8.194,-0.928
  region: -9.464,-0.038 -8.574,-0.038 -8.574,-0.928 -9.464,-0.928
  region: -10.734,-0.038 -9.844,-0.038 -9.844,-0.928 -10.734,-0.928
  region: -12.004,-0.038 -11.114,-0.038 -11.114,-0.928 -12.004,-0.928
  region: -13.274,-0.038 -12.384,-0.038 -12.384,-0.928 -13.274,-0.928
  region: 10.856,-1.308 11.746,-1.308 11.746,-2.198 10.856,-2.198
  region: 9.586,-1.308 10.476,-1.308 10.476,-2.198 9.586,-2.198
  region: 8.316,-1.308 9.206,-1.308 9.206,-2.198 8.316,-2.198
  region: 7.046,-1.308 7.936,-1.308 7.936,-2.198 7.046,-2.198
  region: 5.776,-1.308 6.666,-1.308 6.666,-2.198 5.776,-2.198
  region: 4.506,-1.308 5.396,-1.308 5.396,-2.198 4.506,-2.198
  region: 3.236,-1.308 4.126,-1.308 4.126,-2.198 3.236,-2.198
  region: 1.966,-1.308 2.856,-1.308 2.856,-2.198 1.966,-2.198
  region: 0.696,-1.308 1.586,-1.308 1.586,-2.198 0.696,-2.198
  region: -0.574,-1.308 0.316,-1.308 0.316,-2.198 -0.574,-2.198
  region: -1.844,-1.308 -0.954,-1.308 -0.954,-2.198 -1.844,-2.198
  region: -3.114,-1.308 -2.224,-1.308 -2.224,-2.198 -3.114,-2.198
  region: -4.384,-1.308 -3.494,-1.308 -3.494,-2.198 -4.384,-2.198
  region: -5.654,-1.308 -4.764,-1.308 -4.764,-2.198 -5.654,-2.198
  region: -6.924,-1.308 -6.034,-1.308 -6.034,-2.198 -6.924,-2.198
  region: -8.194,-1.308 -7.304,-1.308 -7.304,-2.198 -8.194,-2.198
  region: -9.464,-1.308 -8.574,-1.308 -8.574,-2.198 -9.464,-2.198
  region: -10.734,-1.308 -9.844,-1.308 -9.844,-2.198 -10.734,-2.198
  region: -12.004,-1.308 -11.114,-1.308 -11.114,-2.198 -12.004,-2.198
  region: -13.274,-1.308 -12.384,-1.308 -12.384,-2.198 -13.274,-2.198
  region: 10.856,-2.578 11.746,-2.578 11.746,-3.468 10.856,-3.468
  region: 9.586,-2.578 10.476,-2.578 10.476,-3.468 9.586,-3.468
  region: 8.316,-2.578 9.206,-2.578 9.206,-3.468 8.316,-3.468
  region: 7.046,-2.578 7.936,-2.578 7.936,-3.468 7.046,-3.468
  region: 5.776,-2.578 6.666,-2.578 6.666,-3.468 5.776,-3.468
  region: 4.506,-2.578 5.396,-2.578 5.396,-3.468 4.506,-3.468
  region: 3.236,-2.578 4.126,-2.578 4.126,-3.468 3.236,-3.468
  region: 1.966,-2.578 2.856,-2.578 2.856,-3.468 1.966,-3.468
  region: 0.696,-2.578 1.586,-2.578 1.586,-3.468 0.696,-3.468
  region: -0.574,-2.578 0.316,-2.578 0.316,-3.468 -0.574,-3.468
  region: -1.844,-2.578 -0.954,-2.578 -0.954,-3.468 -1.844,-3.468
  region: -3.114,-2.578 -2.224,-2.578 -2.224,-3.468 -3.114,-3.468
  region: -4.384,-2.578 -3.494,-2.578 -3.494,-3.468 -4.384,-3.468
  region: -5.654,-2.578 -4.764,-2.578 -4.764,-3.468 -5.654,-3.468
  region: -6.924,-2.578 -6.034,-2.578 -6.034,-3.468 -6.924,-3.468
  region: -8.194,-2.578 -7.304,-2.578 -7.304,-3.468 -8.194,-3.468
  region: -9.464,-2.578 -8.574,-2.578 -8.574,-3.468 -9.464,-3.468
  region: -10.734,-2.578 -9.844,-2.578 -9.844,-3.468 -10.734,-3.468
  region: -12.004,-2.578 -11.114,-2.578 -11.114,-3.468 -12.004,-3.468
  region: -13.274,-2.578 -12.384,-2.578 -12.384,-3.468 -13.274,-3.468
  region: 10.856,-3.848 11.746,-3.848 11.746,-4.738 10.856,-4.738
  region: 9.586,-3.848 10.476,-3.848 10.476,-4.738 9.586,-4.738
  region: 8.316,-3.848 9.206,-3.848 9.206,-4.738 8.316,-4.738
  region: 7.046,-3.848 7.936,-3.848 7.936,-4.738 7.046,-4.738
  region: 5.776,-3.848 6.666,-3.848 6.666,-4.738 5.776,-4.738
  region: 4.506,-3.848 5.396,-3.848 5.396,-4.738 4.506,-4.738
  region: 3.236,-3.848 4.126,-3.848 4.126,-4.738 3.236,-4.738
  region: 1.966,-3.848 2.856,-3.848 2.856,-4.738 1.966,-4.738
  region: 0.696,-3.848 1.586,-3.848 1.586,-4.738 0.696,-4.738
  region: -0.574,-3.848 0.316,-3.848 0.316,-4.738 -0.574,-4.738
  region: -1.844,-3.848 -0.954,-3.848 -0.954,-4.738 -1.844,-4.738
  region: -3.114,-3.848 -2.224,-3.848 -2.224,-4.738 -3.114,-4.738
  region: -4.384,-3.848 -3.494,-3.848 -3.494,-4.738 -4.384,-4.738
  region: -5.654,-3.848 -4.764,-3.848 -4.764,-4.738 -5.654,-4.738
  region: -6.924,-3.848 -6.034,-3.848 -6.034,-4.738 -6.924,-4.738
  region: -8.194,-3.848 -7.304,-3.848 -7.304,-4.738 -8.194,-4.738
  region: -9.464,-3.848 -8.574,-3.848 -8.574,-4.738 -9.464,-4.738
  region: -10.734,-3.848 -9.844,-3.848 -9.844,-4.738 -10.734,-4.738
  region: -12.004,-3.848 -11.114,-3.848 -11.114,-4.738 -12.004,-4.738
  region: -13.274,-3.848 -12.384,-3.848 -12.384,-4.738 -13.274,-4.738
  region: 9.586,-5.118 10.476,-5.118 10.476,-6.008 9.586,-6.008
  region: 8.316,-5.118 9.206,-5.118 9.206,-6.008 8.316,-6.008
  region: 7.046,-5.118 7.936,-5.118 7.936,-6.008 7.046,-6.008
  region: 5.776,-5.118 6.666,-5.118 6.666,-6.008 5.776,-6.008
  region: 4.506,-5.118 5.396,-5.118 5.396,-6.008 4.506,-6.008
  region: 3.236,-5.118 4.126,-5.118 4.126,-6.008 3.236,-6.008
  region: 1.966,-5.118 2.856,-5.118 2.856,-6.008 1.966,-6.008
  region: 0.696,-5.118 1.586,-5.118 1.586,-6.008 0.696,-6.008
  region: -0.574,-5.118 0.316,-5.118 0.316,-6.008 -0.574,-6.008
  region: -1.844,-5.118 -0.954,-5.118 -0.954,-6.008 -1.844,-6.008
  region: -3.114,-5.118 -2.224,-5.118 -2.224,-6.008 -3.114,-6.008
  region: -4.384,-5.118 -3.494,-5.118 -3.494,-6.008 -4.384,-6.008
  region: -5.654,-5.118 -4.764,-5.118 -4.764,-6.008 -5.654,-6.008
  region: -6.924,-5.118 -6.034,-5.118 -6.034,-6.008 -6.924,-6.008
  region: -8.194,-5.118 -7.304,-5.118 -7.304,-6.008 -8.194,-6.008
  region: -9.464,-5.118 -8.574,-5.118 -8.574,-6.008 -9.464,-6.008
  region: -10.734,-5.118 -9.844,-5.118 -9.844,-6.008 -10.734,-6.008
  region: -12.004,-5.118 -11.114,-5.118 -11.114,-6.008 -12.004,-6.008
  region: -13.274,-5.118 -12.384,-5.118 -12.384,-6.008 -13.274,-6.008
Bottom Layer keep-out:
  circle w0.1: c-6.989,-10.16 r2.9
  circle w0.1: c7.061,-10.16 r2.9
  circle w0.1: c-6.989,10.16 r2.9
  circle w0.1: c7.061,10.16 r2.9
Top Overlay:
  drawing of 298 lines, arcs and shapes, not listed
  text "1" at 13.285,-6.049 h1
  text "200" at -14.771,3.515 h1
Mechanical 8:
  drawing of 1722 lines, arcs and shapes, not listed
Mechanical 14:
  drawing of 357 lines, arcs and shapes, not listed
  text "1" at 13.285,-6.049 h1
  text "200" at -14.771,3.515 h1
Mechanical 15:
  lines w0.05: -18.944,-2.155 -14.499,-2.155 -14.499,-7.235 13.591,-7.235 14.499,-6.327 14.499,1.655 18.944,1.655 18.944,5.965 14.499,5.965 14.499,7.235 -14.499,7.235 -14.499,2.155 -18.944,2.155 -18.944,-2.155
3D body: height 2.92, standoff -1.27, extent -18.687,-6.985 18.687,6.985